# Altium footprint library TO系列封装.PcbLib: 129 footprints (part 7 of 9)
Each footprint in its own frame and in the unit in brackets; x right, y up, seen from the top. Pads: shape width x height; smd on the part's side, far side on the other; paste and mask are expansions set on the pad; w line width, h text height; cw(c..) or ccw(c..) is an arc to the next point about the centre after c.
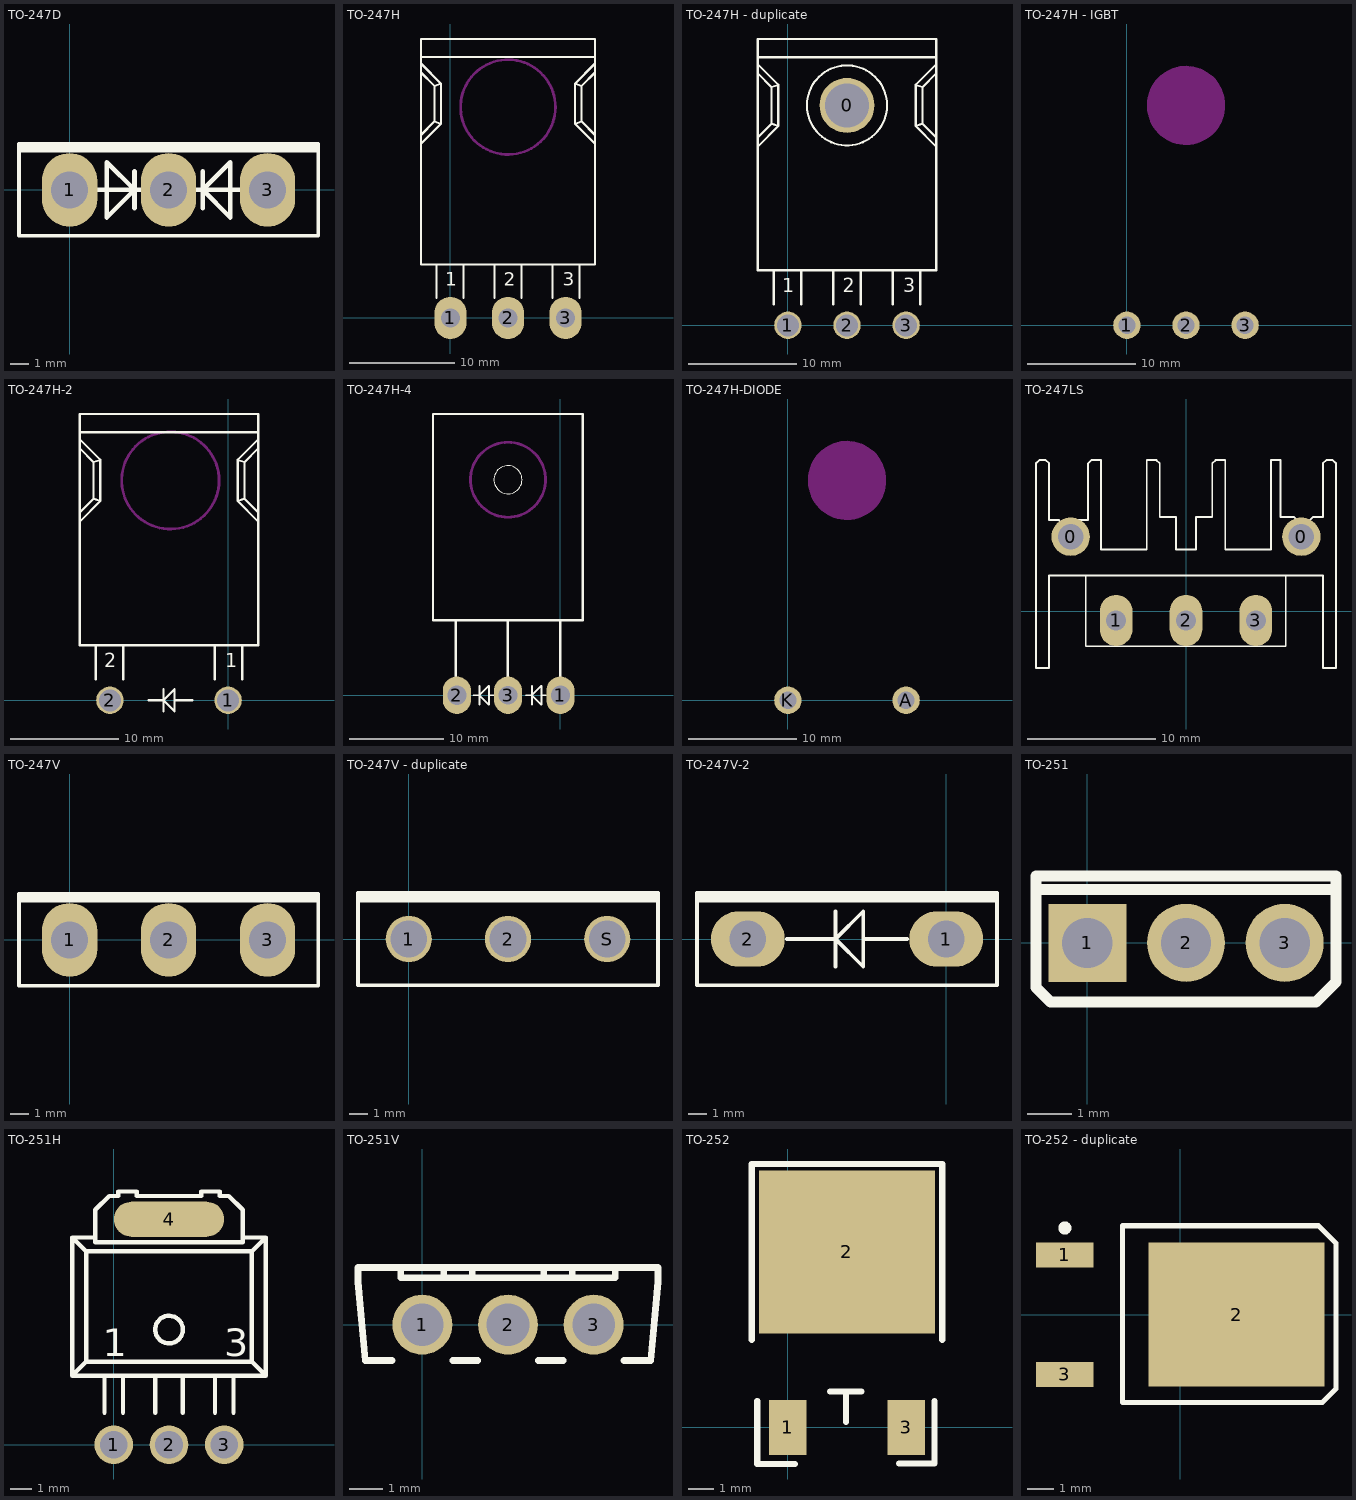
[diagram p6: the footprints below, top view; thin cyan lines are the x and y axes]

## TO-247D [mil]
pads (3):
  oval 120x160 hole 80: 1(0,0) 2(215,0) 3(430,0)
Top Overlay:
  rectangle: -109.96,81.58 541.73,103.74
  lines w7.87: -110,-100 -110,100 540,100 540,-100 -110,-100
  lines w10: 60.86,0 160.86,0 ; 140.86,-40 140.86,40 ; 269.14,0 369.14,0 ; 289.14,-40 289.14,40 ; 80.86,-60 140.86,0 80.86,60 80.86,-40 80.86,-60 ; 289.14,0 349.14,60 349.14,-40 349.14,-60 289.14,0
3D body "User Library-TO_247.STEP": height 1102.36, standoff -316.86, extent -96.02,-94.06 526.02,115

## TO-247H [mil]
pads (3):
  oval 120x157.48 hole 70: 1(0,0) 2(215,0) 3(430,0)
Top Overlay:
  lines w7.87: -110,650 -35,725 ; -110,683.33 -60,733.33 ; -110,916.67 -60,866.67 ; -110,950 -35,875 ; -110,975 540,975 ; -51.67,75 -51.67,200 ; 48.33,75 48.33,200 ; 165,75 165,200 ; 265,75 265,200 ; 381.67,75 381.67,200 ; 481.67,75 481.67,200 ; 540,650 465,725 ; 540,683.33 490,733.33 ; 540,916.67 490,866.67 ; 540,950 465,875 ; -60,733.33 -60,866.67 ; -60,733.33 -35,725 ; -60,866.67 -35,875 ; -35,725 -35,875 ; 465,725 465,875 ; 465,725 490,733.33 ; 465,875 490,866.67 ; 490,733.33 490,866.67 ; -110,200 540,200 540,1041.67 -110,1041.67 -110,200
  text "1" at -20,120 h50
  text "2" at 200,120 h50
  text "3" at 420,120 h50
Keep-Out Layer:
  circle w10: c215,787.4 r177.16
3D body "User Library-TO-247H.STEP": height 114.17, standoff -354.33, extent -90.23,-10 520,990

## TO-247H - duplicate [mil]
pads (4):
  round 200 hole 160: 0(215,800)
  round 100 hole 80: 1(0,0) 2(215,0) 3(430,0)
Top Overlay:
  circle w7.87: c215,800 r145.6
  lines w7.87: -110,650 -35,725 ; -110,683.33 -60,733.33 ; -110,916.67 -60,866.67 ; -110,950 -35,875 ; -110,975 540,975 ; -51.67,75 -51.67,200 ; 48.33,75 48.33,200 ; 165,75 165,200 ; 265,75 265,200 ; 381.67,75 381.67,200 ; 481.67,75 481.67,200 ; 540,650 465,725 ; 540,683.33 490,733.33 ; 540,916.67 490,866.67 ; 540,950 465,875 ; -60,733.33 -35,725 ; -60,733.33 -60,866.67 ; -60,866.67 -35,875 ; -35,725 -35,875 ; 465,725 490,733.33 ; 465,725 465,875 ; 465,875 490,866.67 ; 490,733.33 490,866.67 ; -110,200 -110,1041.67 540,1041.67 540,200 -110,200
  text "3" at 420,120 h50
  text "2" at 200,120 h50
  text "1" at -20,120 h50
3D body "User Library-TO-247H.STEP": height 153.54, standoff -314.96, extent -90,0 520.24,1000

## TO-247H - IGBT [mm]
pads (3):
  round 2.54 hole 1.575: 1(0,0) 2(5.461,0) 3(10.922,0)
Bottom Overlay:
  circle w0.2: c5.461,20.32 r1.5
  lines w0.2: -2.794,16.51 -0.889,18.415 ; -2.794,17.357 -1.524,18.627 ; -2.794,23.283 -1.524,22.013 ; -2.794,24.13 -0.889,22.225 ; -2.794,24.765 13.716,24.765 ; -1.312,1.905 -1.312,5.08 ; 1.228,1.905 1.228,5.08 ; 4.191,1.905 4.191,5.08 ; 6.731,1.905 6.731,5.08 ; 9.694,1.905 9.694,5.08 ; 12.234,1.905 12.234,5.08 ; 13.716,16.51 11.811,18.415 ; 13.716,17.357 12.446,18.627 ; 13.716,23.283 12.446,22.013 ; 13.716,24.13 11.811,22.225 ; -1.524,18.627 -0.889,18.415 ; -1.524,18.627 -1.524,22.013 ; -1.524,22.013 -0.889,22.225 ; -0.889,18.415 -0.889,22.225 ; 11.811,18.415 12.446,18.627 ; 11.811,18.415 11.811,22.225 ; 11.811,22.225 12.446,22.013 ; 12.446,18.627 12.446,22.013 ; -2.794,5.08 -2.794,26.458 13.716,26.458 13.716,5.08 -2.794,5.08
  text "1" at 0.254,3.048 h1.27
  text "2" at 5.842,3.048 h1.27
  text "3" at 11.43,3.048 h1.27
Keep-Out Layer:
  circle w0.1: c5.461,20.32 r3.6
  board cut-out: 9.061,20.326 9.061,20.561 8.999,21.028 8.878,21.482 8.697,21.917 8.462,22.324 8.176,22.697 7.843,23.03 7.47,23.317 7.062,23.552 6.628,23.732 6.173,23.854 5.707,23.915 5.472,23.915 5.451,23.915 5.216,23.915 4.749,23.854 4.294,23.732 3.86,23.552 3.452,23.316 3.079,23.03 2.746,22.697 2.46,22.324 2.224,21.916 2.044,21.481 1.922,21.027 1.861,20.56 1.861,20.325 1.861,20.089 1.923,19.621 2.045,19.165 2.225,18.729 2.461,18.321 2.748,17.946 3.082,17.613 3.457,17.325 3.865,17.089 4.301,16.909 4.757,16.787 5.225,16.725 5.461,16.725 5.481,16.725 5.716,16.725 6.181,16.786 6.634,16.908 7.068,17.087 7.474,17.322 7.846,17.608 8.178,17.939 8.464,18.312 8.698,18.718 8.878,19.152 8.999,19.605 9.061,20.07 9.061,20.305
3D body "TO-247H.STEP": height 8, standoff -3.9, extent -2.289,-0.3 13.211,25.82

## TO-247H-2 [mil]
pads (2):
  round 100 hole 80: 1(0,0) 2(-430,0)
Top Overlay:
  lines w7.87: -540,650 -465,725 ; -540,683.33 -490,733.33 ; -540,916.67 -490,866.67 ; -540,950 -465,875 ; -540,975 110,975 ; -481.67,75 -481.67,200 ; -381.67,75 -381.67,200 ; -48.33,75 -48.33,200 ; 51.67,75 51.67,200 ; 110,650 35,725 ; 110,683.33 60,733.33 ; 110,916.67 60,866.67 ; 110,950 35,875 ; -490,733.33 -490,866.67 ; -490,733.33 -465,725 ; -490,866.67 -465,875 ; -465,725 -465,875 ; 35,725 35,875 ; 35,725 60,733.33 ; 35,875 60,866.67 ; 60,733.33 60,866.67 ; -540,200 110,200 110,1041.67 -540,1041.67 -540,200
  lines w8: -290,0 -260,0 -235,0 ; -235,-40 -235,40 ; -195,0 -130,0 ; -235,0 -195,40 -195,-40 -235,0
  text "2" at -450,120 h50
  text "1" at -10,120 h50
Keep-Out Layer:
  circle w10: c-210,800 r177.16

## TO-247H-4 [mm]
pads (3):
  oval 3x4 hole 2.032: 1(0,0) 2(-11.049,0)
  oval 3x4 hole 2: 3(-5.588,0)
Top Overlay:
  circle w0.1: c-5.588,23 r1.5
  lines w0.203: -9.271,0 -8.636,0 ; -8.636,-1.016 -8.636,1.016 ; -7.62,0 -7.112,0 ; -3.683,0 -3.048,0 ; -3.048,-1.016 -3.048,1.016 ; -2.032,0 -1.524,0 ; -8.636,0 -7.62,1.016 -7.62,-1.016 -8.636,0 ; -3.048,0 -2.032,1.016 -2.032,-1.016 -3.048,0
  lines w0.254: -11.183,2.042 -11.183,8.01 ; -5.595,1.534 -5.595,8.01 ; -0.007,2.042 -0.007,8.01 ; -13.595,8.01 2.405,8.01 2.405,30.01 -13.595,30.01 -13.595,8.01
Bottom Overlay:
  lines w0.254: -11.049,0 -11.049,2.923 ; -5.588,0 -5.588,2.923 ; 0,0 0,2.923
  lines w0.3: -11.088,0 -11.088,3 ; -10.668,8.763 -9.303,8.763 ; -9.303,7.239 -9.303,10.287 ; -7.779,8.763 -6.668,8.763 ; -6.588,23 -4.588,23 ; -5.588,0 -5.588,3 ; -5.588,22 -5.588,24 ; -4.508,8.763 -3.143,8.763 ; -3.143,7.239 -3.143,10.287 ; -1.619,8.763 -0.508,8.763 ; -0.088,0 -0.088,3 ; -15.588,3 -15.588,29 ; -15.588,3 4.412,3 4.412,29 -15.588,29 ; -15.588,3 -15.588,29 ; -9.303,8.763 -7.779,10.287 -7.779,7.239 -9.303,8.763 ; -3.143,8.763 -1.619,10.287 -1.619,7.239 -3.143,8.763
Keep-Out Layer:
  circle w0.3: c-5.588,23 r4
3D body "User Library-TO-247H.STEP": height 3.9, standoff -8, extent -13.084,-0.215 2.416,25.185

## TO-247H-DIODE [mm]
pads (2):
  round 2.54 hole 1.575: A(10.922,0) K(0,0)
Bottom Overlay:
  circle w0.2: c5.461,20.32 r3.7
  lines w0.2: -2.794,16.51 -0.889,18.415 ; -2.794,17.357 -1.524,18.627 ; -2.794,23.283 -1.524,22.013 ; -2.794,24.13 -0.889,22.225 ; -2.794,24.765 13.716,24.765 ; -1.312,1.905 -1.312,5.08 ; 1.228,1.905 1.228,5.08 ; 4.191,1.905 4.191,5.08 ; 6.731,1.905 6.731,5.08 ; 9.694,1.905 9.694,5.08 ; 12.234,1.905 12.234,5.08 ; 13.716,16.51 11.811,18.415 ; 13.716,17.357 12.446,18.627 ; 13.716,23.283 12.446,22.013 ; 13.716,24.13 11.811,22.225 ; -1.524,18.627 -0.889,18.415 ; -1.524,18.627 -1.524,22.013 ; -1.524,22.013 -0.889,22.225 ; -0.889,18.415 -0.889,22.225 ; 11.811,18.415 12.446,18.627 ; 11.811,18.415 11.811,22.225 ; 11.811,22.225 12.446,22.013 ; 12.446,18.627 12.446,22.013 ; -2.794,5.08 -2.794,26.458 13.716,26.458 13.716,5.08 -2.794,5.08
  text "1" at 0.254,3.048 h1.27
  text "2" at 5.842,3.048 h1.27
  text "3" at 11.43,3.048 h1.27
Keep-Out Layer:
  circle w0.1: c5.461,20.32 r3.6
  board cut-out: 9.061,20.326 9.061,20.561 8.999,21.028 8.878,21.482 8.697,21.917 8.462,22.324 8.176,22.697 7.843,23.03 7.47,23.317 7.062,23.552 6.628,23.732 6.173,23.854 5.707,23.915 5.472,23.915 5.451,23.915 5.216,23.915 4.749,23.854 4.294,23.732 3.86,23.552 3.452,23.316 3.079,23.03 2.746,22.697 2.46,22.324 2.224,21.916 2.044,21.481 1.922,21.027 1.861,20.56 1.861,20.325 1.861,20.089 1.923,19.621 2.045,19.165 2.225,18.729 2.461,18.321 2.748,17.946 3.082,17.613 3.457,17.325 3.865,17.089 4.301,16.909 4.757,16.787 5.225,16.725 5.461,16.725 5.481,16.725 5.716,16.725 6.181,16.786 6.634,16.908 7.068,17.087 7.474,17.322 7.846,17.608 8.178,17.939 8.464,18.312 8.698,18.718 8.878,19.152 8.999,19.605 9.061,20.07 9.061,20.305
3D body "TO-247D.STEP": height 1.9, standoff -10, extent -2.289,-0.3 13.211,25.82

## TO-247LS [mm]
pads (5):
  round 3 hole 2: 0(-9,5.822) 0(9,5.822)
  oval 2.54x4 hole 1.575: 1(-5.45,-0.71) 2(0,-0.71) 3(5.45,-0.71)
Top Overlay:
  lines w0.1: -7.8,2.79 -7.8,-2.71 7.8,-2.71 7.8,2.79
  lines w0.15: -9.668,6.018 -9.668,6.854 -9.922,7.108 -10.684,7.108 -10.684,11.536 -10.938,11.79 -11.446,11.79 -11.7,11.536 -11.7,2.79 -11.7,2.536 -11.7,-4.41 -10.684,-4.41 -10.684,2.79 10.684,2.79 10.684,-4.41 11.7,-4.41 11.7,11.536 11.446,11.79 10.938,11.79 10.684,11.536 10.684,7.362 9.922,7.362 9.668,7.108 9.668,6.079 ; -8.652,6.346 -8.652,6.854 -8.398,7.108 -7.636,7.108 -7.636,11.536 -7.382,11.79 -6.62,11.79 -6.62,4.822 -3.064,4.822 -3.064,11.79 -2.302,11.79 -2.048,11.536 -2.048,7.362 -0.778,7.362 -0.778,4.822 0.778,4.822 0.778,7.362 2.048,7.362 2.048,11.536 2.302,11.79 3.064,11.79 3.064,4.822 6.62,4.822 6.62,11.79 7.382,11.79 7.382,7.362 8.398,7.362 8.652,7.108 8.652,6.346
3D body "2SK2225.STEP": height 23, standoff -17.9, extent -7.767,-2.697 7.833,2.803
3D body "User Library-M3x8.STEP": height 20.6, standoff 15, extent -2.8,-4.235 2.8,5.25
3D body "User Library-heat sink-1.step": height 30.62, standoff 0, extent -11.45,-4.485 11.45,11.915

## TO-247V [mil]
pads (3):
  oval 120x160 hole 80: 1(0,0) 2(215,0) 3(430,0)
Top Overlay:
  rectangle: -109.96,81.58 541.73,103.74
  lines w7.87: -110,-100 -110,100 540,100 540,-100 -110,-100
3D body "User Library-TO_247.STEP": height 1102.36, standoff -316.86, extent -97.05,-105 525,104.06

## TO-247V - duplicate [mil]
pads (3):
  round 100 hole 80: 1(0,0) 2(215,0) S(430,0)
Top Overlay:
  lines w7.87: -110,83.33 540,83.33 ; -110,86.67 540,86.67 ; -110,91.67 540,91.67 ; -110,95 540,95 ; -110,-100 -110,100 540,100 540,-100 -110,-100
3D body "User Library-TO_247.STEP": height 984.25, standoff -434.97, extent -96.02,-116.99 526.03,92.06

## TO-247V-2 [mil]
pads (2):
  oval 160x120 hole 80: 1(0,0) 2(-430,0)
Top Overlay:
  lines w7.87: -540,83.33 110,83.33 ; -540,86.67 110,86.67 ; -540,91.67 110,91.67 ; -540,95 110,95 ; -540,-100 -540,100 110,100 110,-100 -540,-100
  lines w8: -345,0 -240,0 ; -240,-60 -240,60 ; -180,0 -85,0 ; -240,0 -180,-60 -180,60 -240,0

## TO-251 [mil]
height 35.43
pads (3):
  rect 70x70 hole 45: 1(0,0)
  round 70 hole 45: 2(88.5,0) 3(177,0)
Top Overlay:
  lines w10: -46,48 222,48 ; -46,-40 -46,60 223,60 223,-35 205,-53 -33,-53 -46,-40
3D body "to-251aa.step": height 388.43, standoff -281.5, extent -38.95,-44 216.95,46.55

## TO-251H [mil]
pads (4):
  round 70 hole 50: 1(0,0) 2(100,0) 3(200,0)
  oval 200x63.65 smd: 4(100,408)
Top Overlay:
  circle w8: c100,208.33 r25
  lines w7.87: -33.33,375 -75,375 ; -16.67,57.87 -16.67,125 ; 16.67,57.87 16.67,125 ; 75,57.87 75,125 ; 125,57.87 125,125 ; 183.33,57.87 183.33,125 ; 216.67,57.87 216.67,125 ; 233.33,375 275,375 ; -75,125 275,125 ; -75,125 -75,375 ; -75,125 -50,150 ; -75,375 -50,350 ; -50,150 -50,350 ; -50,150 250,150 ; -50,350 250,350 ; 250,150 250,350 ; 250,150 275,125 ; 250,350 275,375 ; 275,125 275,375 ; -33.33,366.67 -33.33,425 -8.33,450 8.33,450 8.33,458.33 41.67,458.33 41.67,450 158.33,450 158.33,458.33 191.67,458.33 191.67,450 208.33,450 233.33,425 233.33,366.67 -33.33,366.67
  text "1" at -20,160 h50
  text "3" at 200,160 h50

## TO-251V [mil]
pads (3):
  round 70 hole 50: 1(0,0) 2(100,0) 3(200,0)
Top Overlay:
  lines w7.87: -35.42,-41.67 -66.67,-41.67 -75,50 -75,58.33 -75,66.67 275,66.67 275,50 266.67,-41.67 235.42,-41.67 ; -25,66.67 -25,54.69 225,54.69 225,66.67 ; 25,54.69 25,66.67 ; 35.42,-41.67 64.58,-41.67 ; 58.33,54.69 58.33,66.67 ; 135.42,-41.67 164.58,-41.67 ; 141.67,54.69 141.67,66.67 ; 175,54.69 175,66.67

## TO-252 [mm]
pads (3):
  rect 1.5x2.2 smd: 1(0,0) 3(4.723,0.004)
  rect 7x6.5 smd: 2(2.361,7)
Top Overlay:
  lines w0.254: -1.439,3.5 -1.439,10.5 6.161,10.5 6.161,3.5 ; -1.212,1.054 -1.212,-1.456 -1.012,-1.456 0.276,-1.456 ; 1.697,1.431 2.94,1.431 ; 2.319,0.232 2.319,1.431 ; 4.45,-1.434 5.671,-1.434 5.848,-1.434 5.848,1.055
3D body "User Library-TO252AA.STEP": height 2.3, standoff -0.01, extent -1.016,-0.532 5.564,9.168

## TO-252 - duplicate [mm] "D-PAK  / SOT-428"
height 2.38
pads (3):
  rect 2.2x0.95 smd: 1(-4.4,2.28) 3(-4.4,-2.28)
  rect 6.7x5.5 smd: 2(2.15,0)
Top Overlay:
  circle w0.25: c-4.4,3.305 r0.125
  lines w0.1: -2.2,-3.35 -2.2,3.35
  lines w0.2: -2.2,-3.35 -2.2,3.391 5.278,3.391 5.944,2.725 5.944,-2.824 5.418,-3.35 -2.2,-3.35
3D body "D-PAK.STEP": height 2.31, standoff 0, extent -4.475,-3.3 4.775,3.3